# Altium footprint library Hydra_Ref_pcb.PcbLib: 353 footprints (part 23 of 23)
Each footprint in its own frame and in the unit in brackets; x right, y up, seen from the top. Pads: shape width x height; smd on the part's side, far side on the other; paste and mask are expansions set on the pad; w line width, h text height; cw(c..) or ccw(c..) is an arc to the next point about the centre after c.
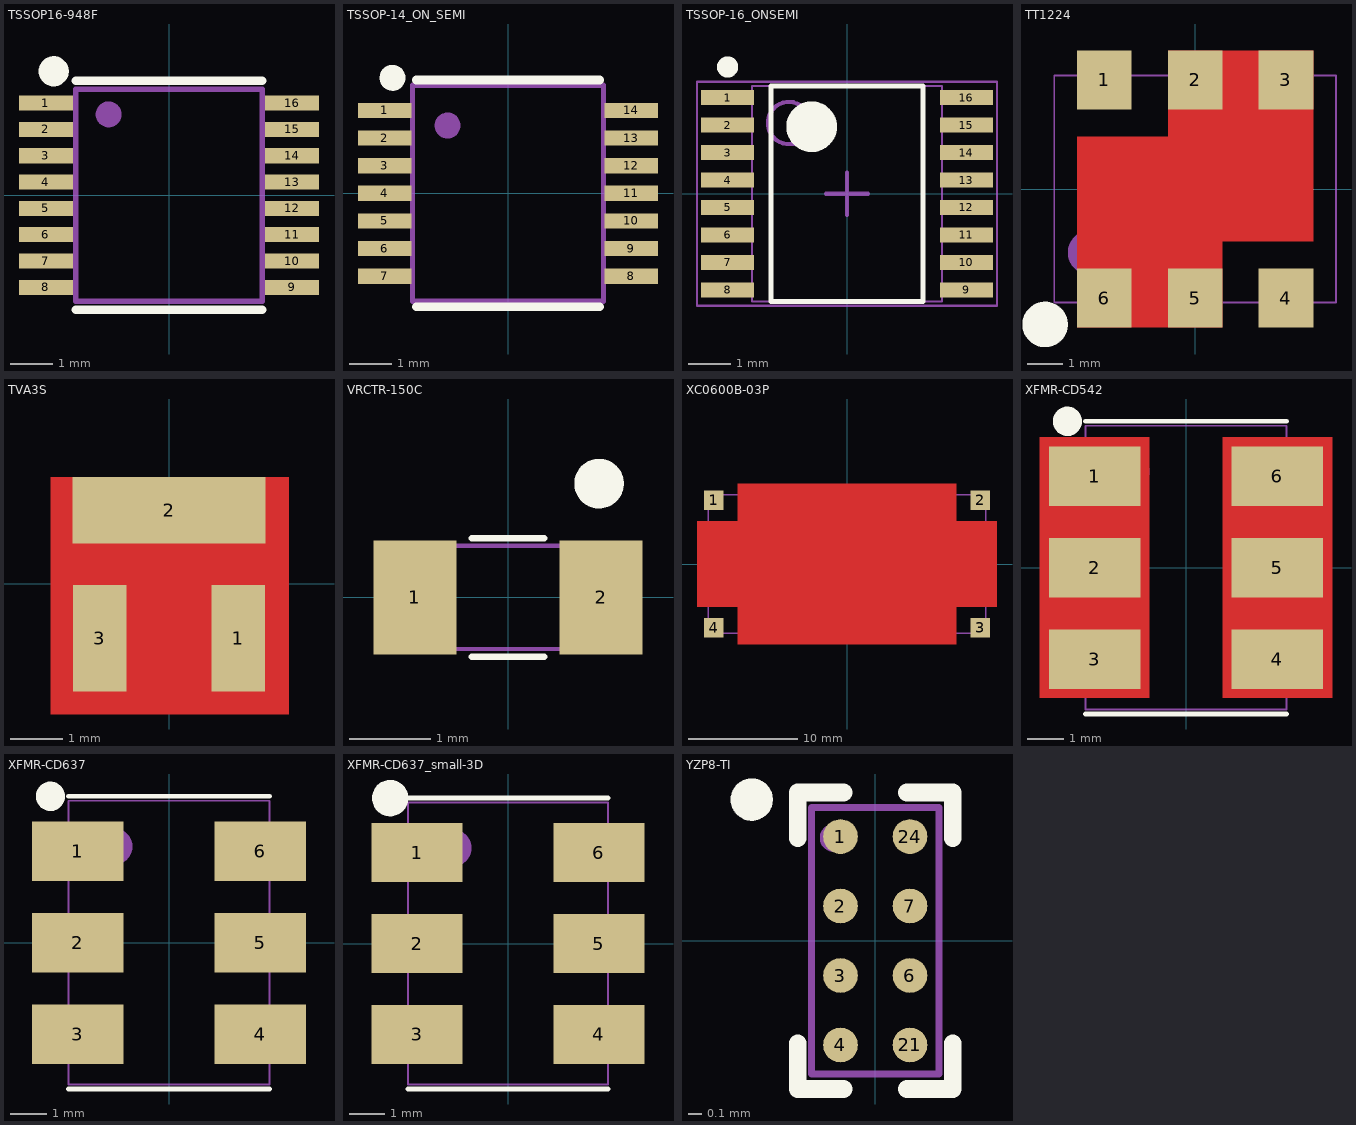
[diagram p22: the footprints below, top view; thin cyan lines are the x and y axes]

## TSSOP16-948F [mm] "CASE 948F"
height 1.194
pads (16):
  rect 1.27x0.356 smd: 1(-2.9,2.17) 2(-2.9,1.55) 3(-2.9,0.93) 4(-2.9,0.31) 5(-2.9,-0.31) 6(-2.9,-0.93) 7(-2.9,-1.55) 8(-2.9,-2.17) 9(2.9,-2.17) 10(2.9,-1.55) 11(2.9,-0.93) 12(2.9,-0.31) 13(2.9,0.31) 14(2.9,0.93) 15(2.9,1.55) 16(2.9,2.17)
Top Overlay:
  circle w0.356: c-2.718,2.921 r0.178
  lines w0.203: -2.2,-2.7 2.2,-2.7 ; -2.2,2.7 2.2,2.7
9 Top Assy:
  circle w0.305: c-1.422,1.905 r0.152
  lines w0.127: -2.2,-2.5 -2.2,2.5 2.2,2.5 2.2,-2.5 -2.2,-2.5
  text ".Designator" at 0.254,-1.778 h0.64
3D body: height 1.2, standoff 0.01, extent -2.2,-2.5 2.2,2.5

## TSSOP-14_ON_SEMI [mm]
height 1.194
pads (14):
  rect 1.26x0.36 smd: 1(-2.9,1.95) 2(-2.9,1.3) 3(-2.9,0.65) 4(-2.9,0) 5(-2.9,-0.65) 6(-2.9,-1.3) 7(-2.9,-1.95) 8(2.9,-1.95) 9(2.9,-1.3) 10(2.9,-0.65) 11(2.9,0) 12(2.9,0.65) 13(2.9,1.3) 14(2.9,1.95)
Top Overlay:
  circle w0.305: c-2.718,2.718 r0.152
  lines w0.203: -2.159,-2.667 2.159,-2.667 ; -2.159,2.667 2.159,2.667
9 Top Assy:
  circle w0.305: c-1.422,1.595 r0.152
  lines w0.127: -2.248,-2.54 2.248,-2.54 2.248,2.54 -2.248,2.54 -2.248,-2.54
  text ".Designator" at 0.254,-2.088 h0.64
3D body: height 1.2, standoff 0.01, extent -2.2,-2.54 2.2,2.54

## TSSOP-16_ONSEMI [mm] "CASE 948F-01, ISSUE B"
height 1.2
pads (16):
  rect 1.25x0.35 smd: 1(-2.825,2.275) 2(-2.825,1.625) 3(-2.825,0.975) 4(-2.825,0.325) 5(-2.825,-0.325) 6(-2.825,-0.975) 7(-2.825,-1.625) 8(-2.825,-2.275) 9(2.825,-2.275) 10(2.825,-1.625) 11(2.825,-0.975) 12(2.825,-0.325) 13(2.825,0.325) 14(2.825,0.975) 15(2.825,1.625) 16(2.825,2.275)
Top Overlay:
  circle w0.6: c-0.837,1.586 r0.3
  circle w0.25: c-2.825,3 r0.125
  lines w0.127: -1.8,-2.55 1.8,-2.55 1.8,2.55 -1.8,2.55 -1.8,-2.55
9 Top Assy:
  circle w0.1: c-1.375,1.675 r0.5
  lines w0.051: -2.25,-2.55 2.25,-2.55 2.25,2.55 -2.25,2.55 -2.25,-2.55
  text ".Designator" at 0.508,-1.777 h1.02
15 Top Optical Placement:
  lines w0.051: -3.55,-2.65 3.55,-2.65 3.55,2.65 -3.55,2.65 -3.55,-2.65
  lines w0.1: -0.5,0 0.5,0 ; 0,-0.5 0,0.5
3D body: height 1.2, standoff 0.05, extent -2.25,-2.55 2.25,2.55

## TT1224 [mil] ".250x.160x.160\" 6pin Frequency Multiplier - Mini-Circuit"
height 160
pads (6):
  rect 60x65 smd: 1(-100,120) 2(0,120) 3(100,120) 4(100,-120) 5(0,-120) 6(-100,-120)
Top Layer:
  region: 130,152.5 -30,152.5 -30,-57.5 130,-57.5
  rectangle: -130,-152.5 30,57.5
Top Overlay:
  circle w30: c-165,-149 r10
Top Solder:
  pour cut-out: -141,164 141,164 141,-164 -141,-164
9 Top Assy:
  circle w30: c-115,-70 r10
  lines w2: -155,-125 -155,125 -120,125 ccw(c-100,125) -80,125 -20,125 ccw(c0,125) 20,125 80,125 ccw(c100,125) 120,125 155,125 155,-125 120,-125 ccw(c100,-125) 80,-125 20,-125 ccw(c0,-125) -20,-125 -80,-125 ccw(c-100,-125) -120,-125 -155,-125
  text ".Designator" at 100.98,44 h60
3D body: height 160, standoff 24, extent -154.98,-109.98 154.98,109.98
3D body: height 24, standoff 0, extent -155.02,-125.02 155.02,125.02

## TVA3S [mil] "ATTENUATOR, .140\" x .123\""
height 21
pads (3):
  rect 40x80 smd: 1(52,-41) 3(-52,-41)
  rect 145x50 smd: 2(0,55)
Top Layer:
  pour cut-out: 90,80 -89,80 -89,-98 90,-98
  pour cut-out: -85,-48 -85,-12 -74,-12 -74,-48
Top Solder:
  pour cut-out: -83,91 83,91 83,-92 -83,-92
9 Top Assy:
  lines w2: -72.5,-2 -72.5,-61.5 ; -72.5,30 72.5,30 ; -32.5,-61.5 -32.5,-1 -72.5,-1 -72.5,-61.5 ; 32.5,-61.5 32.5,-1 72.5,-1 72.5,-61.5 ; 72.45,61.5 -72.5,61.5 -72.5,-61.5 ; 72.5,-2 72.5,-61.5 ; 72.5,61 72.5,-61.5 ; -72.5,-61.5 72.5,-61.5
  text ".Designator" at -56,5 h20
3D body: height 19.68, standoff 0, extent -72.5,-61.5 72.5,61.5

## VRCTR-150C [mil] "VARACTOR .100L .050W .50H"
height 50
pads (2):
  rect 40x55 smd: 1(-45,0) 2(45,0)
Top Overlay:
  circle w12: c44,55 r6
  lines w3: -17.5,-28.66 17.5,-28.66 ; -17.51,28.66 17.49,28.66
9 Top Assy:
  circle w20: c38.5,0.9 r2
  lines w2: -50,-25 50,-25 50,25 -50,25 -50,-25
  text ".Designator" at -45,-9 h18
3D body: height 50, standoff 0, extent -80,-45 80,45

## XC0600B-03P [mil] "XC0600B-03P"
height 220
pads (4):
  rect 70x70 smd: 1(-480,230) 2(480,230) 3(480,-230) 4(-480,-230)
Top Layer:
  region: 540,155 390,155 390,-155 540,-155
  rectangle: -540,-155 -390,155
  rectangle: -395,-290 395,290
9 Top Assy:
  lines w5: -500,-220 cw(c-500,-250) -470,-250 ; -495,220 ccw(c-495,250) -465,250 ; 470,-250 cw(c500,-250) 500,-220 ; 470,250 ccw(c500,250) 500,220 ; -500,-250 -500,250 500,250 500,-250 -500,-250
  text ".Designator" at -16,-8 h18

## XFMR-CD542 [mil] ".220x.310x.112\" 6Pins RF Transformer -Mini-Circuits"
height 112
pads (6):
  rect 100x65 smd: 1(-100,100) 2(-100,0) 3(-100,-100) 4(100,-100) 5(100,0) 6(100,100)
Top Layer:
  pour cut-out: 40,-142.5 160,-142.5 160,142.5 40,142.5
  pour cut-out: -160,-142.5 -40,-142.5 -40,142.5 -160,142.5
Top Overlay:
  circle w16: c-129.6,159.9 r8
  lines w5: -110,-160 110,-160 ; -110,160 110,160
9 Top Assy:
  circle w20: c-60,105 r10
  lines w2: -110,-115 -135,-115 -135,-85 -110,-85 ; -110,-15 -135,-15 -135,15 -110,15 ; -110,85 -135,85 -135,115 -110,115 ; 110,-115 135,-115 135,-85 110,-85 ; 110,-15 135,-15 135,15 110,15 ; 110,85 135,85 135,115 110,115 ; -110,-155 -110,155 110,155 110,-155 -110,-155
  text ".Designator" at 10,-60 h35
3D body: height 112, standoff 0, extent -109.98,-154.98 109.98,154.98

## XFMR-CD637 [mil] ".220x.310x.206\" 6Pins RF Transformer -Mini-Circuits"
height 206
pads (6):
  rect 100x65 smd: 1(-100,100) 2(-100,0) 3(-100,-100) 4(100,-100) 5(100,0) 6(100,100)
Top Overlay:
  circle w16: c-129.6,159.9 r8
  lines w5: -110,-160 110,-160 ; -110,160 110,160
9 Top Assy:
  circle w20: c-60,105 r10
  lines w2: -110,-115 -135,-115 -135,-85 -110,-85 ; -110,-15 -135,-15 -135,15 -110,15 ; -110,85 -135,85 -135,115 -110,115 ; 110,-115 135,-115 135,-85 110,-85 ; 110,-15 135,-15 135,15 110,15 ; 110,85 135,85 135,115 110,115 ; -110,-155 110,-155 110,155 -110,155 -110,-155
  text ".Designator" at 25,-145 h60
3D body: height 206, standoff 0, extent -170,-170 170,170.5

## XFMR-CD637_small-3D [mil] ".220x.310x.206\" 6Pins RF Transformer -Mini-Circuits"
height 206
pads (6):
  rect 100x65 smd: 1(-100,100) 2(-100,0) 3(-100,-100) 4(100,-100) 5(100,0) 6(100,100)
Top Overlay:
  circle w20: c-129.6,159.9 r10
  lines w5: -110,-160 110,-160 ; -110,160 110,160
9 Top Assy:
  circle w20: c-60,105 r10
  lines w2: -110,-115 -135,-115 -135,-85 -110,-85 ; -110,-15 -135,-15 -135,15 -110,15 ; -110,85 -135,85 -135,115 -110,115 ; 110,-115 135,-115 135,-85 110,-85 ; 110,-15 135,-15 135,15 110,15 ; 110,85 135,85 135,115 110,115 ; -110,-155 110,-155 110,155 -110,155 -110,-155
  text ".Designator" at 75,-125 h60
3D body: height 206, standoff 0, extent -155,-170 155,170.5

## YZP8-TI [mm] "BGA, 8-Leads, Body 1.9x0.9mm, Pitch 0.5mm"
height 0.5
pads (8):
  round 0.25 smd mask+0.051: 1(-0.25,0.75) 2(-0.25,0.25) 3(-0.25,-0.25) 4(-0.25,-0.75) 6(0.25,-0.25) 7(0.25,0.25) 21(0.25,-0.75) 24(0.25,0.75)
Top Overlay:
  circle w0.152: c-0.889,1.016 r0.076
  lines w0.127: -0.559,-0.737 -0.559,-1.067 -0.229,-1.067 ; -0.559,0.737 -0.559,1.067 -0.229,1.067 ; 0.229,-1.067 0.559,-1.067 0.559,-0.737 ; 0.229,1.067 0.559,1.067 0.559,0.737
9 Top Assy:
  lines w0.05: -0.459,-0.959 0.459,-0.959 0.459,0.959 -0.459,0.959 -0.459,-0.959
  lines w0.1: -0.25,0.75 ccw(c-0.299,0.741) -0.249,0.741
  text ".Designator" at 0.229,-0.787 h0.38
3D body: height 0.5, standoff 0.15, extent -0.45,-0.95 0.45,0.95